# Altium schematic symbol library Regulator_Switching.SchLib: 1070 symbols (part 2 of 9) (continued)
## LM2672M-5.0 (continued)

## LM2672M-12
designator *  value LM2672M-12
ki_keywords: Step-Down Voltage Regulator 12V 1A; ki_description: 12V, 1A Step-Down Voltage Regulator, SO-8; ki_fp_filters: SOIC*3.9x4.9mm*P1.27mm*; Footprint: Package_SO:SOIC-8_3.9x4.9mm_P1.27mm; Supplier: http://www.ti.com/lit/ds/symlink/lm2672.pdf
footprint SOIC-8_3.9x4.9mm_P1.27mm
pins: 1 CB (in), 2 SS (in), 3 SYNC (in), 4 FB (in), 5 ON/~{{OFF}} (in), 6 GND (power), 7 VIN (power), 8 VSW (out)

## LM2672M-ADJ
designator *  value LM2672M-ADJ
ki_keywords: Step-Down Voltage Regulator; ki_description: Adjustable Output Voltage, 1A Step-Down Voltage Regulator, SO-8; ki_fp_filters: SOIC*3.9x4.9mm*P1.27mm*; Footprint: Package_SO:SOIC-8_3.9x4.9mm_P1.27mm; Supplier: http://www.ti.com/lit/ds/symlink/lm2672.pdf
footprint SOIC-8_3.9x4.9mm_P1.27mm
pins: 1 CB (in), 2 SS (in), 3 SYNC (in), 4 FB (in), 5 ON/~{{OFF}} (in), 6 GND (power), 7 VIN (power), 8 VSW (out)

## LM2672N-3.3
designator *  value LM2672N-3.3
ki_keywords: Step-Down Voltage Regulator 3.3V 1A; ki_description: 3.3V, 1A Step-Down Voltage Regulator, DIP-8; ki_fp_filters: DIP*W7.62mm*; Footprint: Package_DIP:DIP-8_W7.62mm; Supplier: http://www.ti.com/lit/ds/symlink/lm2672.pdf
footprint DIP-8_W7.62mm
pins: 1 CB (in), 2 SS (in), 3 SYNC (in), 4 FB (in), 5 ON/~{{OFF}} (in), 6 GND (power), 7 VIN (power), 8 VSW (out)

## LM2672N-5.0
designator *  value LM2672N-5.0
ki_keywords: Step-Down Voltage Regulator 5V 1A; ki_description: 5V, 1A Step-Down Voltage Regulator, DIP-8; ki_fp_filters: DIP*W7.62mm*; Footprint: Package_DIP:DIP-8_W7.62mm; Supplier: http://www.ti.com/lit/ds/symlink/lm2672.pdf
footprint DIP-8_W7.62mm
pins: 1 CB (in), 2 SS (in), 3 SYNC (in), 4 FB (in), 5 ON/~{{OFF}} (in), 6 GND (power), 7 VIN (power), 8 VSW (out)

## LM2672N-12
designator *  value LM2672N-12
ki_keywords: Step-Down Voltage Regulator 12V 1A; ki_description: 12V, 1A Step-Down Voltage Regulator, DIP-8; ki_fp_filters: DIP*W7.62mm*; Footprint: Package_DIP:DIP-8_W7.62mm; Supplier: http://www.ti.com/lit/ds/symlink/lm2672.pdf
footprint DIP-8_W7.62mm
pins: 1 CB (in), 2 SS (in), 3 SYNC (in), 4 FB (in), 5 ON/~{{OFF}} (in), 6 GND (power), 7 VIN (power), 8 VSW (out)

## LM2672N-ADJ
designator *  value LM2672N-ADJ
ki_keywords: Step-Down Voltage Regulator; ki_description: Adjustable Output Voltage, 1A Step-Down Voltage Regulator, DIP-8; ki_fp_filters: DIP*W7.62mm*; Footprint: Package_DIP:DIP-8_W7.62mm; Supplier: http://www.ti.com/lit/ds/symlink/lm2672.pdf
footprint DIP-8_W7.62mm
pins: 1 CB (in), 2 SS (in), 3 SYNC (in), 4 FB (in), 5 ON/~{{OFF}} (in), 6 GND (power), 7 VIN (power), 8 VSW (out)

## LM2674M-3.3
designator *  value LM2674M-3.3
ki_keywords: Step-Down Voltage Regulator; ki_description: 3.3V, 500mA Step-Down Voltage Regulator, SO-8; ki_fp_filters: SOIC*3.9x4.9mm*P1.27mm*; Footprint: Package_SO:SOIC-8_3.9x4.9mm_P1.27mm; Supplier: http://www.ti.com/lit/ds/symlink/lm2674.pdf
footprint SOIC-8_3.9x4.9mm_P1.27mm
pins: 1 CB (in), 2 NC (in) hidden, 3 NC (in) hidden, 4 FB (in), 5 ON/~{{OFF}} (in), 6 GND (power), 7 VIN (power), 8 VSW (out)

## LM2674M-5.0
designator *  value LM2674M-5.0
ki_keywords: Step-Down Voltage Regulator; ki_description: 5V, 500mA Step-Down Voltage Regulator, SO-8; ki_fp_filters: SOIC*3.9x4.9mm*P1.27mm*; Footprint: Package_SO:SOIC-8_3.9x4.9mm_P1.27mm; Supplier: http://www.ti.com/lit/ds/symlink/lm2674.pdf
footprint SOIC-8_3.9x4.9mm_P1.27mm
pins: 1 CB (in), 2 NC (in) hidden, 3 NC (in) hidden, 4 FB (in), 5 ON/~{{OFF}} (in), 6 GND (power), 7 VIN (power), 8 VSW (out)

## LM2674M-12
designator *  value LM2674M-12
ki_keywords: Step-Down Voltage Regulator 12V 500mA; ki_description: 12V, 500mA Step-Down Voltage Regulator, SO-8; ki_fp_filters: SOIC*3.9x4.9mm*P1.27mm*; Footprint: Package_SO:SOIC-8_3.9x4.9mm_P1.27mm; Supplier: http://www.ti.com/lit/ds/symlink/lm2674.pdf
footprint SOIC-8_3.9x4.9mm_P1.27mm
pins: 1 CB (in), 2 NC (in) hidden, 3 NC (in) hidden, 4 FB (in), 5 ON/~{{OFF}} (in), 6 GND (power), 7 VIN (power), 8 VSW (out)

## LM2674M-ADJ
designator *  value LM2674M-ADJ
ki_keywords: Step-Down Voltage Regulator; ki_description: Adjustable Output Voltage, 500mA Step-Down Voltage Regulator, SO-8; ki_fp_filters: SOIC*3.9x4.9mm*P1.27mm*; Footprint: Package_SO:SOIC-8_3.9x4.9mm_P1.27mm; Supplier: http://www.ti.com/lit/ds/symlink/lm2674.pdf
footprint SOIC-8_3.9x4.9mm_P1.27mm
pins: 1 CB (in), 2 NC (in) hidden, 3 NC (in) hidden, 4 FB (in), 5 ON/~{{OFF}} (in), 6 GND (power), 7 VIN (power), 8 VSW (out)

## LM2674N-3.3
designator *  value LM2674N-3.3
ki_keywords: Step-Down Voltage Regulator; ki_description: 3.3V, 500mA Step-Down Voltage Regulator, DIP-8; ki_fp_filters: DIP*W7.62mm*; Footprint: Package_DIP:DIP-8_W7.62mm; Supplier: http://www.ti.com/lit/ds/symlink/lm2674.pdf
footprint DIP-8_W7.62mm
pins: 1 CB (in), 2 NC (in) hidden, 3 NC (in) hidden, 4 FB (in), 5 ON/~{{OFF}} (in), 6 GND (power), 7 VIN (power), 8 VSW (out)

## LM2674N-5.0
designator *  value LM2674N-5.0
ki_keywords: Step-Down Voltage Regulator; ki_description: 5V, 500mA Step-Down Voltage Regulator, DIP-8; ki_fp_filters: DIP*W7.62mm*; Footprint: Package_DIP:DIP-8_W7.62mm; Supplier: http://www.ti.com/lit/ds/symlink/lm2674.pdf
footprint DIP-8_W7.62mm
pins: 1 CB (in), 2 NC (in) hidden, 3 NC (in) hidden, 4 FB (in), 5 ON/~{{OFF}} (in), 6 GND (power), 7 VIN (power), 8 VSW (out)

## LM2674N-12
designator *  value LM2674N-12
ki_keywords: Step-Down Voltage Regulator 12V 500mA; ki_description: 12V, 500mA Step-Down Voltage Regulator, DIP-8; ki_fp_filters: DIP*W7.62mm*; Footprint: Package_DIP:DIP-8_W7.62mm; Supplier: http://www.ti.com/lit/ds/symlink/lm2674.pdf
footprint DIP-8_W7.62mm
pins: 1 CB (in), 2 NC (in) hidden, 3 NC (in) hidden, 4 FB (in), 5 ON/~{{OFF}} (in), 6 GND (power), 7 VIN (power), 8 VSW (out)

## LM2674N-ADJ
designator *  value LM2674N-ADJ
ki_keywords: Step-Down Voltage Regulator; ki_description: Adjustable Output Voltage, 500mA Step-Down Voltage Regulator, DIP-8; ki_fp_filters: DIP*W7.62mm*; Footprint: Package_DIP:DIP-8_W7.62mm; Supplier: http://www.ti.com/lit/ds/symlink/lm2674.pdf
footprint DIP-8_W7.62mm
pins: 1 CB (in), 2 NC (in) hidden, 3 NC (in) hidden, 4 FB (in), 5 ON/~{{OFF}} (in), 6 GND (power), 7 VIN (power), 8 VSW (out)

## LM2675M-3.3
designator *  value LM2675M-3.3
ki_keywords: Step-Down Voltage Regulator 3.3V 1A; ki_description: 3.3V, 1A Step-Down Voltage Regulator, SO-8; ki_fp_filters: SOIC*3.9x4.9mm*P1.27mm*; Footprint: Package_SO:SOIC-8_3.9x4.9mm_P1.27mm; Supplier: http://www.ti.com/lit/ds/symlink/lm2675.pdf
footprint SOIC-8_3.9x4.9mm_P1.27mm
pins: 1 CB (in), 2 NC (in) hidden, 3 NC (in) hidden, 4 FB (in), 5 ON/~{{OFF}} (in), 6 GND (power), 7 VIN (power), 8 VSW (out)

## LM2675M-5
designator *  value LM2675M-5
ki_keywords: Step-Down Voltage Regulator 5V 1A; ki_description: 5V, 1A Step-Down Voltage Regulator, SO-8; ki_fp_filters: SOIC*3.9x4.9mm*P1.27mm*; Footprint: Package_SO:SOIC-8_3.9x4.9mm_P1.27mm; Supplier: http://www.ti.com/lit/ds/symlink/lm2675.pdf
footprint SOIC-8_3.9x4.9mm_P1.27mm
pins: 1 CB (in), 2 NC (in) hidden, 3 NC (in) hidden, 4 FB (in), 5 ON/~{{OFF}} (in), 6 GND (power), 7 VIN (power), 8 VSW (out)

## LM2675M-12
designator *  value LM2675M-12
ki_keywords: Step-Down Voltage Regulator 12V 1A; ki_description: 12V, 1A Step-Down Voltage Regulator, SO-8; ki_fp_filters: SOIC*3.9x4.9mm*P1.27mm*; Footprint: Package_SO:SOIC-8_3.9x4.9mm_P1.27mm; Supplier: http://www.ti.com/lit/ds/symlink/lm2675.pdf
footprint SOIC-8_3.9x4.9mm_P1.27mm
pins: 1 CB (in), 2 NC (in) hidden, 3 NC (in) hidden, 4 FB (in), 5 ON/~{{OFF}} (in), 6 GND (power), 7 VIN (power), 8 VSW (out)

## LM2675M-ADJ
designator *  value LM2675M-ADJ
ki_keywords: Step-Down Voltage Regulator Adjustable; ki_description: Adjustable Output Voltage, 1A Step-Down Voltage Regulator, SO-8; ki_fp_filters: SOIC*3.9x4.9mm*P1.27mm*; Footprint: Package_SO:SOIC-8_3.9x4.9mm_P1.27mm; Supplier: http://www.ti.com/lit/ds/symlink/lm2675.pdf
footprint SOIC-8_3.9x4.9mm_P1.27mm
pins: 1 CB (in), 2 NC (in) hidden, 3 NC (in) hidden, 4 FB (in), 5 ON/~{{OFF}} (in), 6 GND (power), 7 VIN (power), 8 VSW (out)

## LM2675N-3.3
designator *  value LM2675N-3.3
ki_keywords: Step-Down Voltage Regulator 3.3V 1A; ki_description: 3.3V, 1A Step-Down Voltage Regulator, DIP-8; ki_fp_filters: DIP*W7.62mm*; Footprint: Package_DIP:DIP-8_W7.62mm; Supplier: http://www.ti.com/lit/ds/symlink/lm2675.pdf
footprint DIP-8_W7.62mm
pins: 1 CB (in), 2 NC (in) hidden, 3 NC (in) hidden, 4 FB (in), 5 ON/~{{OFF}} (in), 6 GND (power), 7 VIN (power), 8 VSW (out)

## LM2675N-5
designator *  value LM2675N-5
ki_keywords: Step-Down Voltage Regulator 5V 1A; ki_description: 5V, 1A Step-Down Voltage Regulator, DIP-8; ki_fp_filters: DIP*W7.62mm*; Footprint: Package_DIP:DIP-8_W7.62mm; Supplier: http://www.ti.com/lit/ds/symlink/lm2675.pdf
footprint DIP-8_W7.62mm
pins: 1 CB (in), 2 NC (in) hidden, 3 NC (in) hidden, 4 FB (in), 5 ON/~{{OFF}} (in), 6 GND (power), 7 VIN (power), 8 VSW (out)

## LM2675N-12
designator *  value LM2675N-12
ki_keywords: Step-Down Voltage Regulator 12V 1A; ki_description: 12V, 1A Step-Down Voltage Regulator, DIP-8; ki_fp_filters: DIP*W7.62mm*; Footprint: Package_DIP:DIP-8_W7.62mm; Supplier: http://www.ti.com/lit/ds/symlink/lm2675.pdf
footprint DIP-8_W7.62mm
pins: 1 CB (in), 2 NC (in) hidden, 3 NC (in) hidden, 4 FB (in), 5 ON/~{{OFF}} (in), 6 GND (power), 7 VIN (power), 8 VSW (out)

## LM2675N-ADJ
designator *  value LM2675N-ADJ
ki_keywords: Step-Down Voltage Regulator Adjustable; ki_description: Adjustable Output Voltage, 1A Step-Down Voltage Regulator, DIP-8; ki_fp_filters: DIP*W7.62mm*; Footprint: Package_DIP:DIP-8_W7.62mm; Supplier: http://www.ti.com/lit/ds/symlink/lm2675.pdf
footprint DIP-8_W7.62mm
pins: 1 CB (in), 2 NC (in) hidden, 3 NC (in) hidden, 4 FB (in), 5 ON/~{{OFF}} (in), 6 GND (power), 7 VIN (power), 8 VSW (out)

## LM2731XMF
designator *  value LM2731XMF
ki_keywords: Miniature Step-Up Boost Voltage Regulator; ki_description: LM27313, 1.8A, 22Vout Boost Voltage Regulator, 1.6MHz Frequency, SOT-23-5; ki_fp_filters: SOT?23*; Footprint: Package_TO_SOT_SMD:SOT-23-5; Supplier: http://www.ti.com/lit/ds/symlink/lm2731.pdf
footprint SOT-23-5
pins: 1 SW (out), 2 GND (power), 3 FB (in), 4 EN (in), 5 VIN (in)

## LM2731YMF
designator *  value LM2731YMF
ki_keywords: Miniature Step-Up Boost Voltage Regulator; ki_description: LM27313, 1.8A, 22Vout Boost Voltage Regulator, 600KHz Frequency,; ki_fp_filters: SOT?23*; Footprint: Package_TO_SOT_SMD:SOT-23-5; Supplier: http://www.ti.com/lit/ds/symlink/lm2731.pdf
footprint SOT-23-5
pins: 1 SW (out), 2 GND (power), 3 FB (in), 4 EN (in), 5 VIN (in)

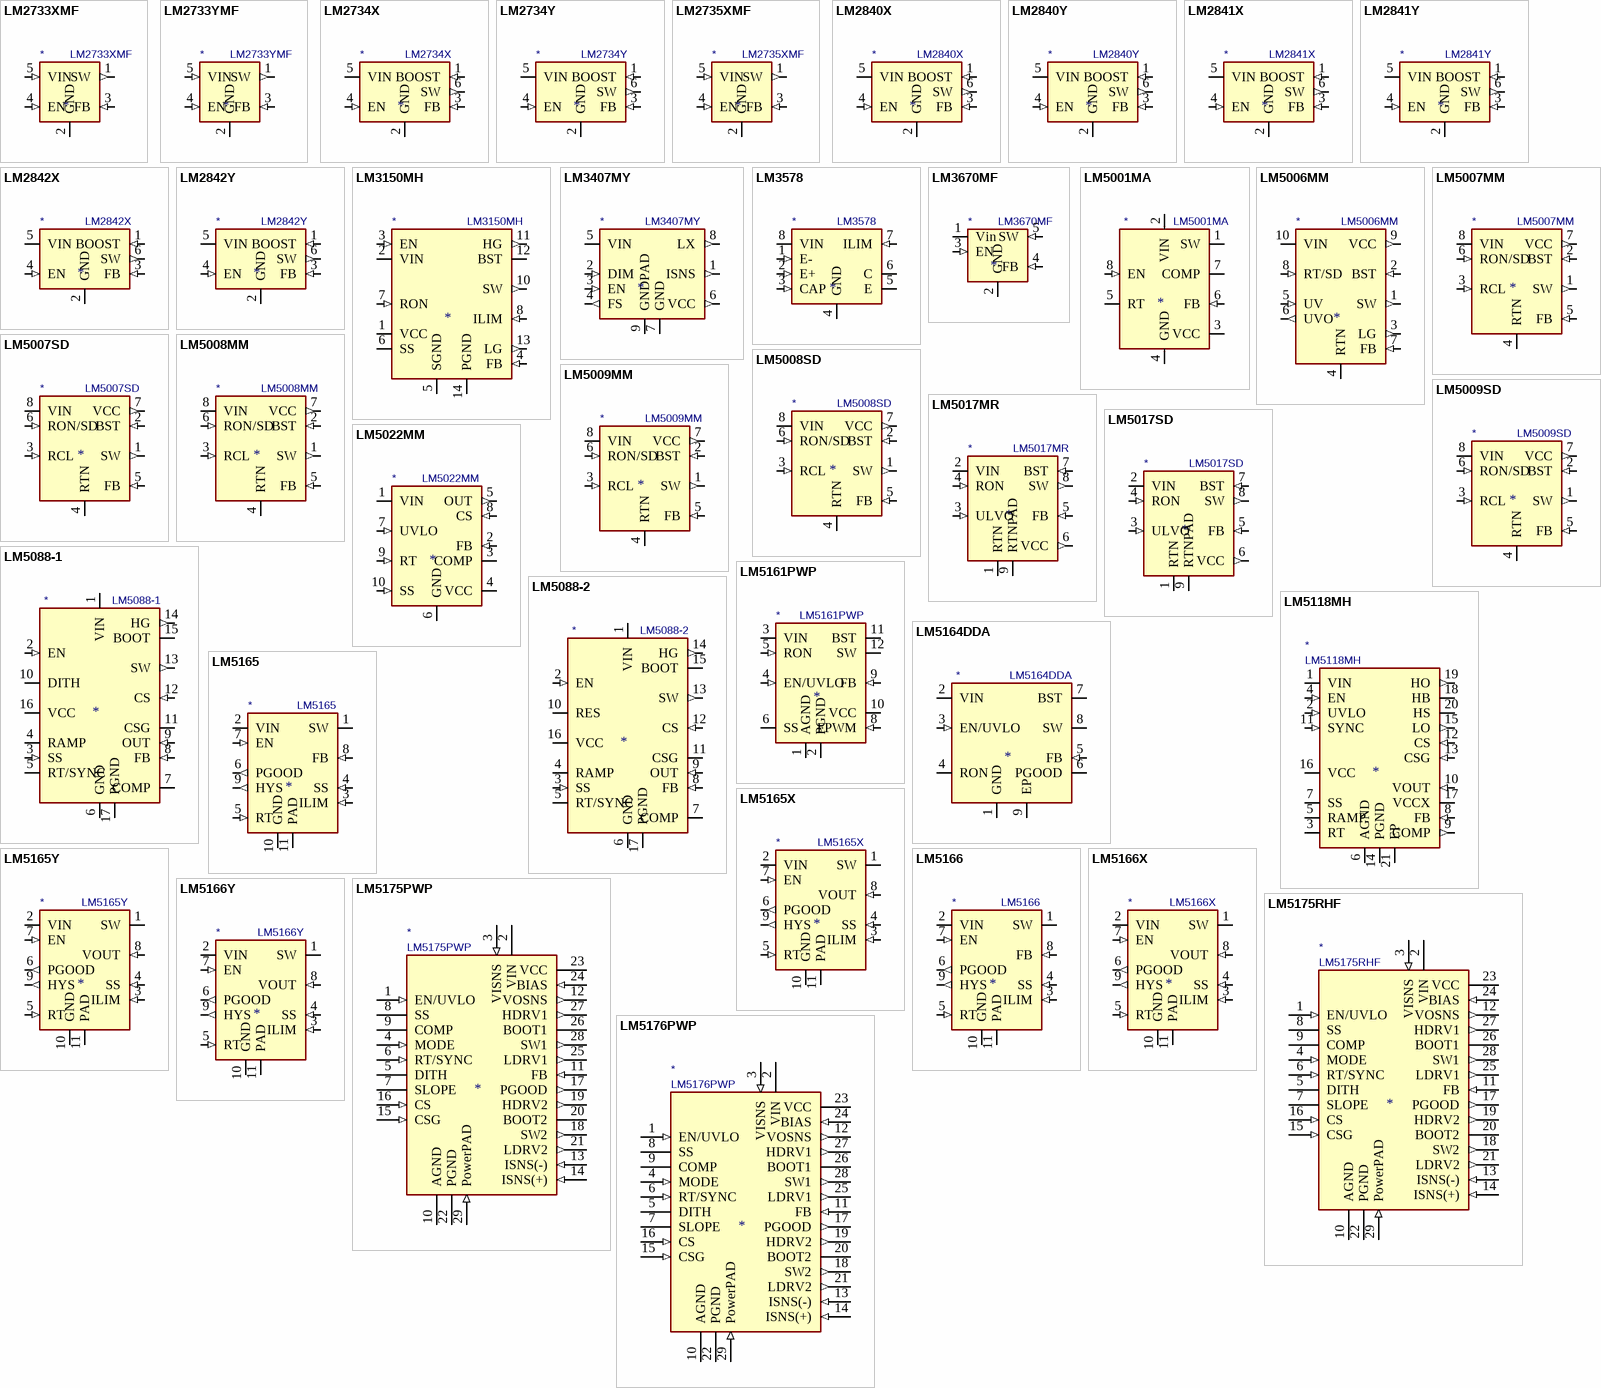
[diagram p6: symbols LM2733XMF to LM5176PWP]

## LM2733XMF
designator *  value LM2733XMF
ki_keywords: Miniature Step-Up Boost Voltage Regulator; ki_description: LM27313, 1A, 40Vout Boost Voltage Regulator, 1.6MHz Frequency, SOT-23-5; ki_fp_filters: SOT?23*; Footprint: Package_TO_SOT_SMD:SOT-23-5; Supplier: http://www.ti.com/lit/ds/symlink/lm2733.pdf
footprint SOT-23-5
pins: 1 SW (out), 2 GND (power), 3 FB (in), 4 EN (in), 5 VIN (in)

## LM2733YMF
designator *  value LM2733YMF
ki_keywords: Miniature Step-Up Boost Voltage Regulator; ki_description: LM27313, 1A, 40Vout Boost Voltage Regulator, 600KHz Frequency,; ki_fp_filters: SOT?23*; Footprint: Package_TO_SOT_SMD:SOT-23-5; Supplier: http://www.ti.com/lit/ds/symlink/lm2733.pdf
footprint SOT-23-5
pins: 1 SW (out), 2 GND (power), 3 FB (in), 4 EN (in), 5 VIN (in)

## LM2734X
designator *  value LM2734X
ki_keywords: Miniature Step-Down Buck Voltage Regulator; ki_description: 1A Step-Down DC-DC Regulator, Adjustable Output Voltage, 1.6MHz, TSOT-23-5; ki_fp_filters: TSOT?23*; Footprint: Package_TO_SOT_SMD:TSOT-23-6; Supplier: http://www.ti.com/lit/ds/symlink/lm2734.pdf
footprint TSOT-23-6
pins: 1 BOOST (in), 2 GND (power), 3 FB (in), 4 EN (in), 5 VIN (power), 6 SW (out)

## LM2734Y
designator *  value LM2734Y
ki_keywords: Miniature Step-Down Buck Voltage Regulator; ki_description: 1A Step-Down DC-DC Regulator, Adjustable Output Voltage, 550kHz, TSOT-23-5; ki_fp_filters: TSOT?23*; Footprint: Package_TO_SOT_SMD:TSOT-23-6; Supplier: http://www.ti.com/lit/ds/symlink/lm2734.pdf
footprint TSOT-23-6
pins: 1 BOOST (in), 2 GND (power), 3 FB (in), 4 EN (in), 5 VIN (power), 6 SW (out)

## LM2735XMF
designator *  value LM2735XMF
ki_keywords: Miniature Step-Up Boost Flyback SEPIC Voltage Regulator; ki_description: LM27313, 2.1A, 24Vout Boost/FlybacK/SEPIC Voltage Regulator, 520kHz/1.6MHz Frequency,; ki_fp_filters: SOT?23*; Footprint: Package_TO_SOT_SMD:SOT-23-5; Supplier: http://www.ti.com/lit/ds/symlink/lm2735.pdf
footprint SOT-23-5
pins: 1 SW (out), 2 GND (power), 3 FB (in), 4 EN (in), 5 VIN (in)

## LM2840X
designator *  value LM2840X
ki_keywords: Miniature Step-Down Buck Voltage Regulator; ki_description: 100mA 42V Input Step-Down DC-DC Regulator, Adjustable Output Voltage, 550kHz, TSOT-23-5; ki_fp_filters: TSOT?23*; Footprint: Package_TO_SOT_SMD:TSOT-23-6; Supplier: http://www.ti.com/lit/ds/symlink/lm2842-q1.pdf
footprint TSOT-23-6
pins: 1 BOOST (in), 2 GND (power), 3 FB (in), 4 EN (in), 5 VIN (power), 6 SW (out)

## LM2840Y
designator *  value LM2840Y
ki_keywords: Miniature Step-Down Buck Voltage Regulator; ki_description: 100mA 42V Input Step-Down DC-DC Regulator, Adjustable Output Voltage, 1.25MHz, TSOT-23-5; ki_fp_filters: TSOT?23*; Footprint: Package_TO_SOT_SMD:TSOT-23-6; Supplier: http://www.ti.com/lit/ds/symlink/lm2842-q1.pdf
footprint TSOT-23-6
pins: 1 BOOST (in), 2 GND (power), 3 FB (in), 4 EN (in), 5 VIN (power), 6 SW (out)

## LM2841X
designator *  value LM2841X
ki_keywords: Miniature Step-Down Buck Voltage Regulator; ki_description: 300mA 42V Input Step-Down DC-DC Regulator, Adjustable Output Voltage, 550kHz, TSOT-23-5; ki_fp_filters: TSOT?23*; Footprint: Package_TO_SOT_SMD:TSOT-23-6; Supplier: http://www.ti.com/lit/ds/symlink/lm2842-q1.pdf
footprint TSOT-23-6
pins: 1 BOOST (in), 2 GND (power), 3 FB (in), 4 EN (in), 5 VIN (power), 6 SW (out)

## LM2841Y
designator *  value LM2841Y
ki_keywords: Miniature Step-Down Buck Voltage Regulator; ki_description: 300mA 42V Input Step-Down DC-DC Regulator, Adjustable Output Voltage, 1.25MHz, TSOT-23-5; ki_fp_filters: TSOT?23*; Footprint: Package_TO_SOT_SMD:TSOT-23-6; Supplier: http://www.ti.com/lit/ds/symlink/lm2842-q1.pdf
footprint TSOT-23-6
pins: 1 BOOST (in), 2 GND (power), 3 FB (in), 4 EN (in), 5 VIN (power), 6 SW (out)

## LM2842X
designator *  value LM2842X
ki_keywords: Miniature Step-Down Buck Voltage Regulator; ki_description: 600mA 42V Input Step-Down DC-DC Regulator, Adjustable Output Voltage, 550kHz, TSOT-23-5; ki_fp_filters: TSOT?23*; Footprint: Package_TO_SOT_SMD:TSOT-23-6; Supplier: http://www.ti.com/lit/ds/symlink/lm2842-q1.pdf
footprint TSOT-23-6
pins: 1 BOOST (in), 2 GND (power), 3 FB (in), 4 EN (in), 5 VIN (power), 6 SW (out)

## LM2842Y
designator *  value LM2842Y
ki_keywords: Miniature Step-Down Buck Voltage Regulator; ki_description: 600mA 42V Input Step-Down DC-DC Regulator, Adjustable Output Voltage, 1.25MHz, TSOT-23-5; ki_fp_filters: TSOT?23*; Footprint: Package_TO_SOT_SMD:TSOT-23-6; Supplier: http://www.ti.com/lit/ds/symlink/lm2842-q1.pdf
footprint TSOT-23-6
pins: 1 BOOST (in), 2 GND (power), 3 FB (in), 4 EN (in), 5 VIN (power), 6 SW (out)

## LM3150MH
designator *  value LM3150MH
ki_keywords: Buck step-down converter; ki_description: 42V Wide Vin synchronous Buck controller, HTSSOP-14; ki_fp_filters: HTSSOP*4.4x5mm*P0.65*; Footprint: Package_SO:HTSSOP-14-1EP_4.4x5mm_P0.65mm_EP3.4x5mm_Mask3x3.1mm; Supplier: http://www.ti.com/lit/ds/symlink/lm3150.pdf
footprint HTSSOP-14-1EP_4.4x5mm_P0.65mm_EP3.4x5mm_Mask3x3.1mm
pins: 1 VCC (power), 2 VIN (power), 3 EN (in), 4 FB (in), 5 SGND (power), 6 SS, 7 RON (in), 8 ILIM (in), 9 SGND (power) hidden, 10 SW (out), 11 HG (out), 12 BST, 13 LG (out), 14 PGND (power), 15 SGND (power) hidden

## LM3407MY
designator *  value LM3407MY
ki_keywords: LED Step-Down Switching Regulator; ki_description: LED Lighting CC Floating Buck Switching Regulator, MSOP-8; ki_fp_filters: MSOP*1EP*3x3mm*P0.65mm*; Footprint: Package_SO:MSOP-8-1EP_3x3mm_P0.65mm_EP1.73x1.85mm_ThermalVias; Supplier: http://www.ti.com/lit/ds/symlink/lm3407.pdf
footprint MSOP-8-1EP_3x3mm_P0.65mm_EP1.73x1.85mm_ThermalVias
pins: 1 ISNS (out), 2 DIM (in), 3 EN (in), 4 FS (out), 5 VIN (power), 6 VCC (out), 7 GND (power), 8 LX (out), 9 GNDPAD (power)

## LM3578
designator *  value LM3578
ki_keywords: switching regulator; ki_description: 750mA, Switching Regulator, adjustable output voltage, DIP-8/SOIC-8; ki_fp_filters: DIP*W7.62mm* SOIC*3.9x4.9mm*; Supplier: http://www.ti.com/lit/ds/symlink/lm3578a.pdf
pins: 1 E- (in), 2 E+ (in), 3 CAP (in), 4 GND (power), 5 E (oe), 6 C (oc), 7 ILIM (in), 8 VIN (power)

## LM3670MF
designator *  value LM3670MF
ki_keywords: DC-DC buck converter step down voltage regulator; ki_description: Miniature Step-Down DC-DC Converter for Ultralow Voltage Circuits, 2.5V < Vin < 5.5V, adjustable output voltage, SOT-23-5; ki_fp_filters: TSOT?23*; Footprint: Package_TO_SOT_SMD:TSOT-23-5; Supplier: http://www.ti.com/lit/ds/symlink/lm3670.pdf
footprint TSOT-23-5
pins: 1 Vin (power), 2 GND (power), 3 EN (in), 4 FB (in), 5 SW (in)

## LM5001MA
designator *  value LM5001MA
ki_keywords: High-Voltage Switch-mode Regulator Flyback SEPIC Boost; ki_description: 1A, High Voltage (75V) Switch-Mode Regulator, Adjustable Output Voltage, SOIC-8; ki_fp_filters: SOIC*3.9x4.9mm*P1.27mm*; Footprint: Package_SO:SOIC-8_3.9x4.9mm_P1.27mm; Supplier: http://www.ti.com/lit/ds/symlink/lm5001.pdf
footprint SOIC-8_3.9x4.9mm_P1.27mm
pins: 1 SW (oc), 2 VIN (power), 3 VCC, 4 GND (power), 5 RT, 6 FB (in), 7 COMP (oc), 8 EN (in)

## LM5006MM
designator *  value LM5006MM
ki_keywords: Constant On-Time Buck Switching Regulator; ki_description: 600mA, 80V Constant On-Time Buck Switching Regulator, MSOP-10; ki_fp_filters: MSOP*3x3mm*P0.5mm*; Footprint: Package_SO:MSOP-10_3x3mm_P0.5mm; Supplier: http://www.ti.com/lit/ds/symlink/lm5006.pdf
footprint MSOP-10_3x3mm_P0.5mm
pins: 1 SW (out), 2 BST (in), 3 LG (out), 4 RTN (power), 5 UV (in), 6 UVO (out), 7 FB (in), 8 RT/SD (in), 9 VCC (out), 10 VIN (power)

## LM5007MM
designator *  value LM5007MM
ki_keywords: Step-Down Switching Regulator; ki_description: 700mA, High Voltage (80V) Step-Down Switching Regulator, Adjustable Output Voltage, MSOP-8; ki_fp_filters: MSOP*3x3mm*P0.65mm*; Footprint: Package_SO:MSOP-8_3x3mm_P0.65mm; Supplier: http://www.ti.com/lit/ds/symlink/lm5007.pdf
footprint MSOP-8_3x3mm_P0.65mm
pins: 1 SW (out), 2 BST (in), 3 RCL (in), 4 RTN (power), 5 FB (in), 6 RON/SD (in), 7 VCC (out), 8 VIN (power)

## LM5007SD
designator *  value LM5007SD
ki_keywords: Step-Down Switching Regulator; ki_description: 700mA, High Voltage (80V) Step-Down Switching Regulator, Adjustable Output Voltage, WSON-8; ki_fp_filters: WSON*1EP*4x4mm*P0.8mm*; Footprint: Package_SON:WSON-8-1EP_4x4mm_P0.8mm_EP2.6x3mm; Supplier: http://www.ti.com/lit/ds/symlink/lm5007.pdf
footprint WSON-8-1EP_4x4mm_P0.8mm_EP2.6x3mm
pins: 1 SW (out), 2 BST (in), 3 RCL (in), 4 RTN (power), 5 FB (in), 6 RON/SD (in), 7 VCC (out), 8 VIN (power), 9 PAD hidden

## LM5008MM
designator *  value LM5008MM
ki_keywords: Step-Down Switching Regulator; ki_description: 500mA, High Voltage (100V) Step-Down Switching Regulator, Adjustable Output Voltage, MSOP-8; ki_fp_filters: MSOP*3x3mm*P0.65mm*; Footprint: Package_SO:MSOP-8_3x3mm_P0.65mm; Supplier: http://www.ti.com/lit/ds/symlink/lm5008.pdf
footprint MSOP-8_3x3mm_P0.65mm
pins: 1 SW (out), 2 BST (in), 3 RCL (in), 4 RTN (power), 5 FB (in), 6 RON/SD (in), 7 VCC (out), 8 VIN (power)

## LM5008SD
designator *  value LM5008SD
ki_keywords: Step-Down Switching Regulator; ki_description: 500mA, High Voltage (100V) Step-Down Switching Regulator, Adjustable Output Voltage, WSON-8; ki_fp_filters: WSON*1EP*4x4mm*P0.8mm*; Footprint: Package_SON:WSON-8-1EP_4x4mm_P0.8mm_EP2.6x3mm; Supplier: http://www.ti.com/lit/ds/symlink/lm5008.pdf
footprint WSON-8-1EP_4x4mm_P0.8mm_EP2.6x3mm
pins: 1 SW (out), 2 BST (in), 3 RCL (in), 4 RTN (power), 5 FB (in), 6 RON/SD (in), 7 VCC (out), 8 VIN (power), 9 PAD hidden

## LM5009MM
designator *  value LM5009MM
ki_keywords: Step-Down Switching Regulator; ki_description: 150mA, High Voltage (80V) Step-Down Switching Regulator, Adjustable Output Voltage, MSOP-8; ki_fp_filters: MSOP*3x3mm*P0.65mm*; Footprint: Package_SO:MSOP-8_3x3mm_P0.65mm; Supplier: http://www.ti.com/lit/ds/symlink/lm5009.pdf
footprint MSOP-8_3x3mm_P0.65mm
pins: 1 SW (out), 2 BST (in), 3 RCL (in), 4 RTN (power), 5 FB (in), 6 RON/SD (in), 7 VCC (out), 8 VIN (power)

## LM5009SD
designator *  value LM5009SD
ki_keywords: Step-Down Switching Regulator; ki_description: 500mA, High Voltage (80V) Step-Down Switching Regulator, Adjustable Output Voltage, WSON-8; ki_fp_filters: WSON*1EP*4x4mm*P0.8mm*; Footprint: Package_SON:WSON-8-1EP_4x4mm_P0.8mm_EP2.6x3mm; Supplier: http://www.ti.com/lit/ds/symlink/lm5009.pdf
footprint WSON-8-1EP_4x4mm_P0.8mm_EP2.6x3mm
pins: 1 SW (out), 2 BST (in), 3 RCL (in), 4 RTN (power), 5 FB (in), 6 RON/SD (in), 7 VCC (out), 8 VIN (power), 9 PAD hidden

## LM5017MR
designator *  value LM5017MR
ki_keywords: Step-Down Switching Regulator High Voltage; ki_description: 600mA, 100V Step-Down Switching Regulator, PowerSO-8; ki_fp_filters: SOIC*1EP*3.9x4.9mm*P1.27mm*; Footprint: Package_SO:SOIC-8-1EP_3.9x4.9mm_P1.27mm_EP2.95x4.9mm_Mask2.71x3.4mm_ThermalVias; Supplier: http://www.ti.com/lit/ds/symlink/lm5017.pdf
footprint SOIC-8-1EP_3.9x4.9mm_P1.27mm_EP2.95x4.9mm_Mask2.71x3.4mm_ThermalVias
pins: 1 RTN (power), 2 VIN (power), 3 ULVO (in), 4 RON (in), 5 FB (in), 6 VCC (out), 7 BST (in), 8 SW (out), 9 RTNPAD (power)

## LM5017SD
designator *  value LM5017SD
ki_keywords: Step-Down Switching Regulator High Voltage; ki_description: 600mA, 100V Step-Down Switching Regulator, WSON-8; ki_fp_filters: WSON*1EP*4x4mm*P0.8mm*; Footprint: Package_SON:WSON-8-1EP_4x4mm_P0.8mm_EP1.98x3mm; Supplier: http://www.ti.com/lit/ds/symlink/lm5017.pdf
footprint WSON-8-1EP_4x4mm_P0.8mm_EP1.98x3mm
pins: 1 RTN (power), 2 VIN (power), 3 ULVO (in), 4 RON (in), 5 FB (in), 6 VCC (out), 7 BST (in), 8 SW (out), 9 RTNPAD (power)

## LM5022MM
designator *  value LM5022MM
ki_keywords: boost switching controller; ki_description: 60-V Low-Side Controller for Boost and SEPIC, MSOP-10; ki_fp_filters: MSOP*3x3mm*P0.5mm*; Footprint: Package_SO:MSOP-10_3x3mm_P0.5mm; Supplier: http://www.ti.com/lit/ds/symlink/lm5022.pdf
footprint MSOP-10_3x3mm_P0.5mm
pins: 1 VIN (power), 2 FB (in), 3 COMP (io), 4 VCC (power), 5 OUT (out), 6 GND (power), 7 UVLO (in), 8 CS (in), 9 RT (in), 10 SS (in)

## LM5088-1
designator *  value LM5088-1
ki_keywords: step down buck high voltage; ki_description: Wide Input Range Non-Synchronous Buck Controller, Frequency Dithering, 75V, HTSSOP-16; ki_fp_filters: HTSSOP*1EP*4.4x5mm*P0.65mm*; Footprint: Package_SO:HTSSOP-16-1EP_4.4x5mm_P0.65mm_EP3.4x5mm_Mask3x3mm_ThermalVias; Supplier: http://www.ti.com/lit/ds/symlink/lm5088.pdf
footprint HTSSOP-16-1EP_4.4x5mm_P0.65mm_EP3.4x5mm_Mask3x3mm_ThermalVias
pins: 1 VIN (power), 2 EN (in), 3 SS (in), 4 RAMP, 5 RT/SYNC, 6 GND (power), 7 COMP, 8 FB (in), 9 OUT (in), 10 DITH, 11 CSG, 12 CS (in), 13 SW (out), 14 HG (out), 15 BOOT, 16 VCC (power), 17 PGND

## LM5088-2
designator *  value LM5088-2
ki_keywords: step down buck high voltage; ki_description: Wide Input Range Non-Synchronous Buck Controller, Hiccup Mode Restart, 75V, HTSSOP-16; ki_fp_filters: HTSSOP*1EP*4.4x5mm*P0.65mm*; Footprint: Package_SO:HTSSOP-16-1EP_4.4x5mm_P0.65mm_EP3.4x5mm_Mask3x3mm_ThermalVias; Supplier: http://www.ti.com/lit/ds/symlink/lm5088.pdf
footprint HTSSOP-16-1EP_4.4x5mm_P0.65mm_EP3.4x5mm_Mask3x3mm_ThermalVias
pins: 1 VIN (power), 2 EN (in), 3 SS (in), 4 RAMP, 5 RT/SYNC, 6 GND (power), 7 COMP, 8 FB (in), 9 OUT (in), 10 RES, 11 CSG, 12 CS (in), 13 SW (out), 14 HG (out), 15 BOOT, 16 VCC (power), 17 PGND

## LM5118MH
designator *  value LM5118MH
ki_keywords: Buck Boost step-up step-down; ki_description: Wide Voltage Range Buck-Boost Controller, HTSSOP-20; ki_fp_filters: Texas*PWP0020A*; Footprint: Package_SO:Texas_PWP0020A; Supplier: https://www.ti.com/lit/ds/symlink/lm5118.pdf
footprint Texas_PWP0020A
pins: 1 VIN (power), 2 UVLO (in), 3 RT, 4 EN (in), 5 RAMP, 6 AGND (power), 7 SS, 8 FB (in), 9 COMP (out), 10 VOUT (in), 11 SYNC (in), 12 CS (in), 13 CSG (in), 14 PGND (power), 15 LO (out), 16 VCC (power), 17 VCCX (power), 18 HB, 19 HO (out), 20 HS, 21 EP

## LM5161PWP
designator *  value LM5161PWP
ki_keywords: step-down dc-dc buck regulator adjustable; ki_description: 1A Synchronous Buck/Fly-buck Converter, 4.5V-100V input, adjustable output voltage, HTSSOP-14; ki_fp_filters: HTSSOP*1EP*4.4x5*P0.65mm*; Footprint: Package_SO:HTSSOP-14-1EP_4.4x5mm_P0.65mm_EP3.4x5mm_Mask3x3.1mm; Supplier: http://www.ti.com/lit/ds/symlink/lm5161.pdf
footprint HTSSOP-14-1EP_4.4x5mm_P0.65mm_EP3.4x5mm_Mask3x3.1mm
pins: 1 AGND (power), 2 PGND (power), 3 VIN (power), 4 EN/UVLO (in), 5 RON (in), 6 SS, 7 NC (in) hidden, 8 FPWM (in), 9 FB (in), 10 VCC (power), 11 BST, 12 SW (power), 13 SW hidden, 14 NC (in) hidden, 15 AGND hidden

## LM5164DDA
designator *  value LM5164DDA
ki_keywords: step-down dc-dc buck regulator adjustable; ki_description: 1A synchronous buck converter with ultra-low IQ, 6V - 100V input, adjustable output voltage, HSOP-8; ki_fp_filters: HSOP*1EP*3.9x4.9*P1.27mm*; Footprint: Package_SO:HSOP-8-1EP_3.9x4.9mm_P1.27mm_EP2.41x3.1mm_ThermalVias; Supplier: https://www.ti.com/lit/ds/symlink/lm5164.pdf?ts=1598311864250&ref_url=https%253A%252F%252Fwww.ti.com%252Fproduct%252FLM5164%253FHQS%253DTI-null-null-octopart-df-pf-null-wwe
footprint HSOP-8-1EP_3.9x4.9mm_P1.27mm_EP2.41x3.1mm_ThermalVias
pins: 1 GND (power), 2 VIN (power), 3 EN/UVLO (in), 4 RON, 5 FB (in), 6 PGOOD (oc), 7 BST, 8 SW (power), 9 EP

## LM5165
designator *  value LM5165
ki_keywords: step-down dc-dc buck regulator adjustable; ki_description: 150mA Synchronous Buck Converter With Ultra-Low IQ, 3V-65V input, adjustable output voltage, DFN-10; ki_fp_filters: Texas*PVSON*N10*; Footprint: Package_SON:Texas_S-PVSON-N10_ThermalVias; Supplier: http://www.ti.com/lit/ds/symlink/lm5165.pdf
footprint Texas_S-PVSON-N10_ThermalVias
pins: 1 SW (power), 2 VIN (power), 3 ILIM (in), 4 SS (in), 5 RT (in), 6 PGOOD (out), 7 EN (in), 8 FB (in), 9 HYS (out), 10 GND (power), 11 PAD (power)

## LM5165X
designator *  value LM5165X
ki_keywords: step-down dc-dc buck regulator fixed 5V; ki_description: 150mA Synchronous Buck Converter With Ultra-Low IQ, 3V-65V input, 5.0V fixed output voltage, DFN-10; ki_fp_filters: Texas*PVSON*N10*; Footprint: Package_SON:Texas_S-PVSON-N10_ThermalVias; Supplier: http://www.ti.com/lit/ds/symlink/lm5165.pdf
footprint Texas_S-PVSON-N10_ThermalVias
pins: 1 SW (power), 2 VIN (power), 3 ILIM (in), 4 SS (in), 5 RT (in), 6 PGOOD (out), 7 EN (in), 8 VOUT (in), 9 HYS (out), 10 GND (power), 11 PAD (power)

## LM5165Y
designator *  value LM5165Y
ki_keywords: step-down dc-dc buck regulator fixed 3V3; ki_description: 150mA Synchronous Buck Converter With Ultra-Low IQ, 3V-65V input, 3.3V fixed output voltage, DFN-10; ki_fp_filters: Texas*PVSON*N10*; Footprint: Package_SON:Texas_S-PVSON-N10_ThermalVias; Supplier: http://www.ti.com/lit/ds/symlink/lm5165.pdf
footprint Texas_S-PVSON-N10_ThermalVias
pins: 1 SW (power), 2 VIN (power), 3 ILIM (in), 4 SS (in), 5 RT (in), 6 PGOOD (out), 7 EN (in), 8 VOUT (in), 9 HYS (out), 10 GND (power), 11 PAD (power)

## LM5166
designator *  value LM5166
ki_keywords: step-down dc-dc buck regulator adjustable; ki_description: 500mA Synchronous Buck Converter With Ultra-Low IQ, 3V-65V input, adjustable output voltage, DFN-10; ki_fp_filters: Texas*PVSON*N10*; Footprint: Package_SON:Texas_S-PVSON-N10_ThermalVias; Supplier: http://www.ti.com/lit/ds/symlink/lm5166.pdf
footprint Texas_S-PVSON-N10_ThermalVias
pins: 1 SW (power), 2 VIN (power), 3 ILIM (in), 4 SS (in), 5 RT (in), 6 PGOOD (out), 7 EN (in), 8 FB (in), 9 HYS (out), 10 GND (power), 11 PAD (power)

## LM5166X
designator *  value LM5166X
ki_keywords: step-down dc-dc buck regulator fixed 5V; ki_description: 500mA Synchronous Buck Converter With Ultra-Low IQ, 3V-65V input, 5.0V fixed output voltage, DFN-10; ki_fp_filters: Texas*PVSON*N10*; Footprint: Package_SON:Texas_S-PVSON-N10_ThermalVias; Supplier: http://www.ti.com/lit/ds/symlink/lm5166.pdf
footprint Texas_S-PVSON-N10_ThermalVias
pins: 1 SW (power), 2 VIN (power), 3 ILIM (in), 4 SS (in), 5 RT (in), 6 PGOOD (out), 7 EN (in), 8 VOUT (in), 9 HYS (out), 10 GND (power), 11 PAD (power)

## LM5166Y
designator *  value LM5166Y
ki_keywords: step-down dc-dc buck regulator fixed 3V3; ki_description: 500mA Synchronous Buck Converter With Ultra-Low IQ, 3V-65V input, 3.3V fixed output voltage, DFN-10; ki_fp_filters: Texas*PVSON*N10*; Footprint: Package_SON:Texas_S-PVSON-N10_ThermalVias; Supplier: http://www.ti.com/lit/ds/symlink/lm5166.pdf
footprint Texas_S-PVSON-N10_ThermalVias
pins: 1 SW (power), 2 VIN (power), 3 ILIM (in), 4 SS (in), 5 RT (in), 6 PGOOD (out), 7 EN (in), 8 VOUT (in), 9 HYS (out), 10 GND (power), 11 PAD (power)

## LM5175PWP
designator *  value LM5175PWP
ki_keywords: Buck Boost step-up step-down; ki_description: 42-V wide Vin synchronous 4-switch Buck-Boost controller, HTSSOP-28 package; ki_fp_filters: HTSSOP*4.4x9.7mm*P0.65*ThermalVias*; Footprint: Package_SO:HTSSOP-28-1EP_4.4x9.7mm_P0.65mm_EP3.4x9.5mm_ThermalVias; Supplier: http://www.ti.com/lit/ds/symlink/lm5175.pdf
footprint HTSSOP-28-1EP_4.4x9.7mm_P0.65mm_EP3.4x9.5mm_ThermalVias
pins: 1 EN/UVLO (in), 2 VIN (power), 3 VISNS (in), 4 MODE (in), 5 DITH, 6 RT/SYNC (in), 7 SLOPE, 8 SS, 9 COMP, 10 AGND (power), 11 FB (in), 12 VOSNS (out), 13 ISNS(-) (in), 14 ISNS(+) (in), 15 CSG (in), 16 CS (in), 17 PGOOD (out), 18 SW2 (out), 19 HDRV2 (out), 20 BOOT2, 21 LDRV2 (out), 22 PGND (power), 23 VCC (power), 24 BIAS (in), 25 LDRV1 (out), 26 BOOT1, 27 HDRV1 (out), 28 SW1 (out), 29 PowerPAD (in)

## LM5175RHF
designator *  value LM5175RHF
ki_keywords: Buck Boost step-up step-down; ki_description: 42-V wide Vin synchronous 4-switch Buck-Boost controller, QFN-28 package; ki_fp_filters: VQFN*4x5mm*P0.5*; Footprint: Package_DFN_QFN:VQFN-28-1EP_4x5mm_P0.5mm_EP2.55x3.55mm; Supplier: http://www.ti.com/lit/ds/symlink/lm5175.pdf
footprint VQFN-28-1EP_4x5mm_P0.5mm_EP2.55x3.55mm
pins: 1 EN/UVLO (in), 2 VIN (power), 3 VISNS (in), 4 MODE (in), 5 DITH, 6 RT/SYNC (in), 7 SLOPE, 8 SS, 9 COMP, 10 AGND (power), 11 FB (in), 12 VOSNS (out), 13 ISNS(-) (in), 14 ISNS(+) (in), 15 CSG (in), 16 CS (in), 17 PGOOD (out), 18 SW2 (out), 19 HDRV2 (out), 20 BOOT2, 21 LDRV2 (out), 22 PGND (power), 23 VCC (power), 24 BIAS (in), 25 LDRV1 (out), 26 BOOT1, 27 HDRV1 (out), 28 SW1 (out), 29 PowerPAD (in)

## LM5176PWP
designator *  value LM5176PWP
ki_keywords: Buck Boost step-up step-down; ki_description: 55-V wide Vin synchronous 4-switch Buck-Boost controller, HTSSOP-28 package; ki_fp_filters: HTSSOP*4.4x9.7mm*P0.65*ThermalVias*; Footprint: Package_SO:HTSSOP-28-1EP_4.4x9.7mm_P0.65mm_EP3.4x9.5mm_ThermalVias; Supplier: http://www.ti.com/lit/ds/symlink/lm5176.pdf
footprint HTSSOP-28-1EP_4.4x9.7mm_P0.65mm_EP3.4x9.5mm_ThermalVias
pins: 1 EN/UVLO (in), 2 VIN (power), 3 VISNS (in), 4 MODE (in), 5 DITH, 6 RT/SYNC (in), 7 SLOPE, 8 SS, 9 COMP, 10 AGND (power), 11 FB (in), 12 VOSNS (out), 13 ISNS(-) (in), 14 ISNS(+) (in), 15 CSG (in), 16 CS (in), 17 PGOOD (out), 18 SW2 (out), 19 HDRV2 (out), 20 BOOT2, 21 LDRV2 (out), 22 PGND (power), 23 VCC (power), 24 BIAS (in), 25 LDRV1 (out), 26 BOOT1, 27 HDRV1 (out), 28 SW1 (out), 29 PowerPAD (in)

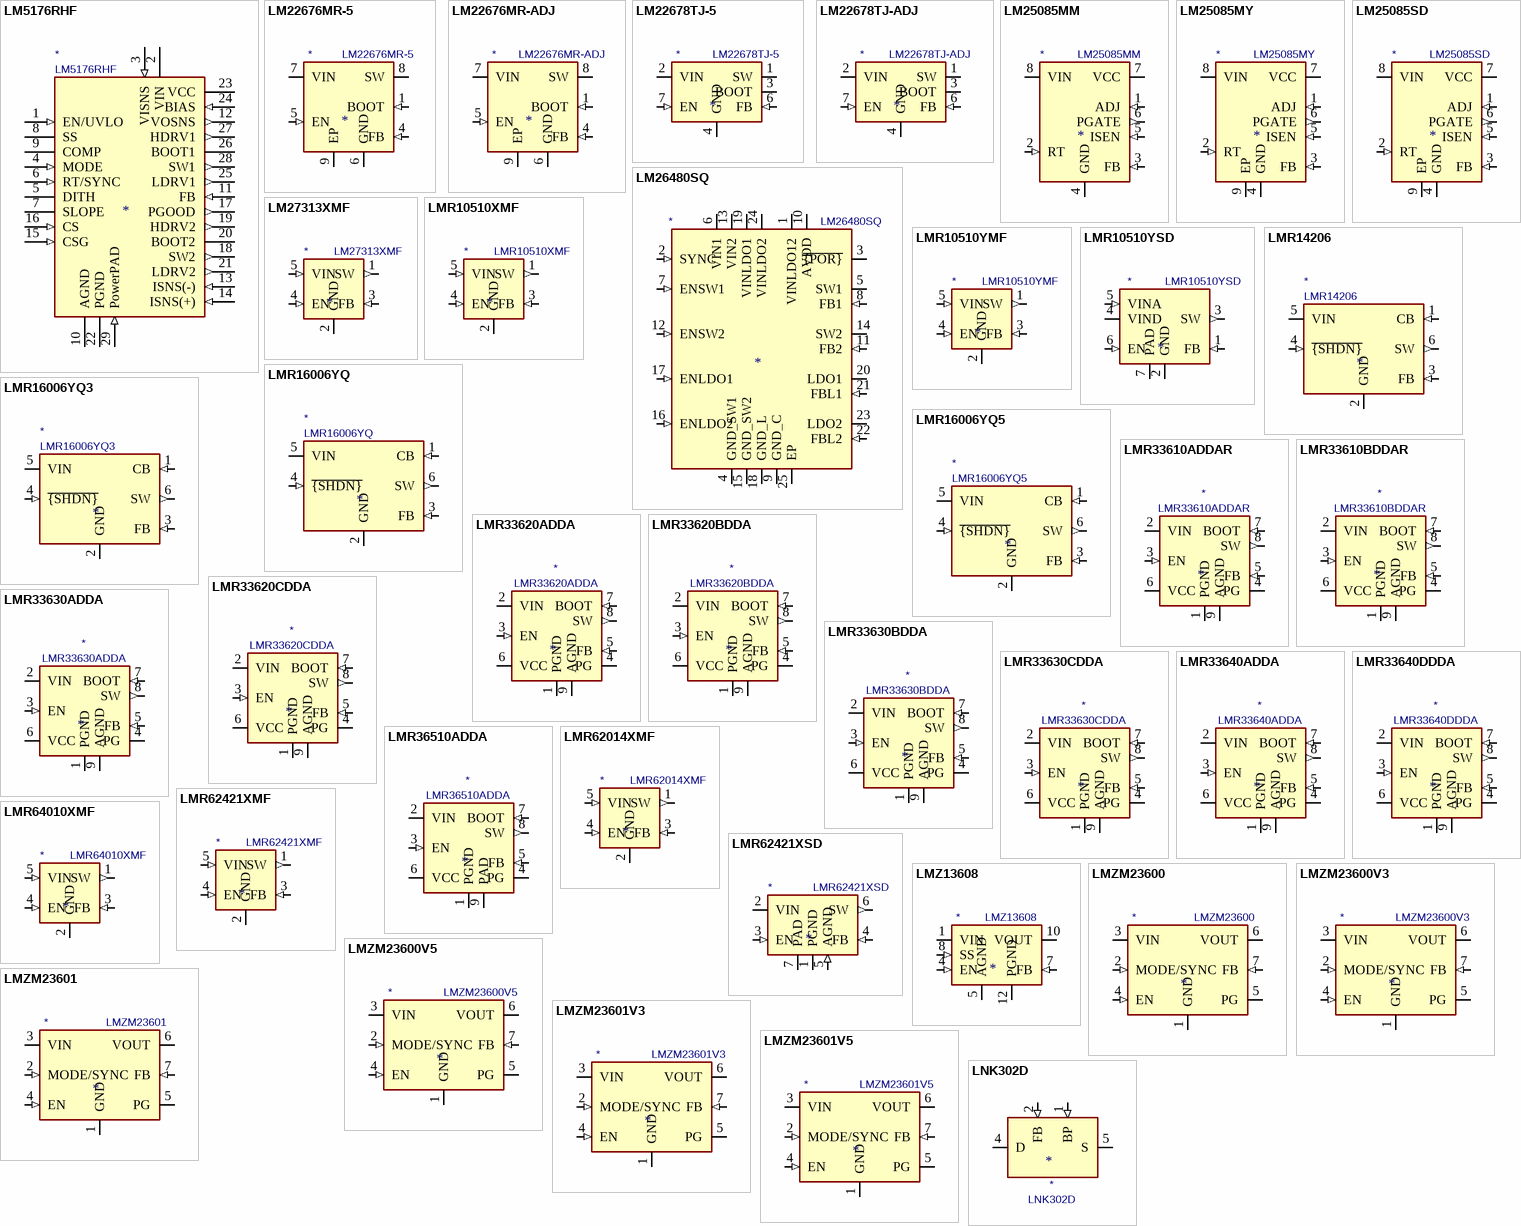
[diagram p7: symbols LM5176RHF to LNK302D]

## LM5176RHF
designator *  value LM5176RHF
ki_keywords: Buck Boost step-up step-down; ki_description: 55-V wide Vin synchronous 4-switch Buck-Boost controller, QFN-28 package; ki_fp_filters: VQFN*4x5mm*P0.5*; Footprint: Package_DFN_QFN:VQFN-28-1EP_4x5mm_P0.5mm_EP2.55x3.55mm; Supplier: http://www.ti.com/lit/ds/symlink/lm5176.pdf
footprint VQFN-28-1EP_4x5mm_P0.5mm_EP2.55x3.55mm
pins: 1 EN/UVLO (in), 2 VIN (power), 3 VISNS (in), 4 MODE (in), 5 DITH, 6 RT/SYNC (in), 7 SLOPE, 8 SS, 9 COMP, 10 AGND (power), 11 FB (in), 12 VOSNS (out), 13 ISNS(-) (in), 14 ISNS(+) (in), 15 CSG (in), 16 CS (in), 17 PGOOD (out), 18 SW2 (out), 19 HDRV2 (out), 20 BOOT2, 21 LDRV2 (out), 22 PGND (power), 23 VCC (power), 24 BIAS (in), 25 LDRV1 (out), 26 BOOT1, 27 HDRV1 (out), 28 SW1 (out), 29 PowerPAD (in)

## LM22676MR-5
designator *  value LM22676MR-5
ki_keywords: DC/DC Buck Converter 3A; ki_description: 3A Step-Down Switching Voltage Regulater, 4.5-42V Input, 5V Output, 500kHz Switching Frequency, SOIC-8; ki_fp_filters: TI*SO*PowerPAD*; Footprint: Package_SO:TI_SO-PowerPAD-8; Supplier: http://www.ti.com/lit/ds/symlink/lm22676.pdf
footprint TI_SO-PowerPAD-8
pins: 1 BOOT (in), 2 NC (in) hidden, 3 NC (in) hidden, 4 FB (in), 5 EN (in), 6 GND (power), 7 VIN (power), 8 SW (power), 9 EP (power)